# Altium footprint library ICs_imp.PCBLIB: 118 footprints (part 7 of 8)
Each footprint in its own frame and in the unit in brackets; x right, y up, seen from the top. Pads: shape width x height; smd on the part's side, far side on the other; paste and mask are expansions set on the pad; w line width, h text height; cw(c..) or ccw(c..) is an arc to the next point about the centre after c.
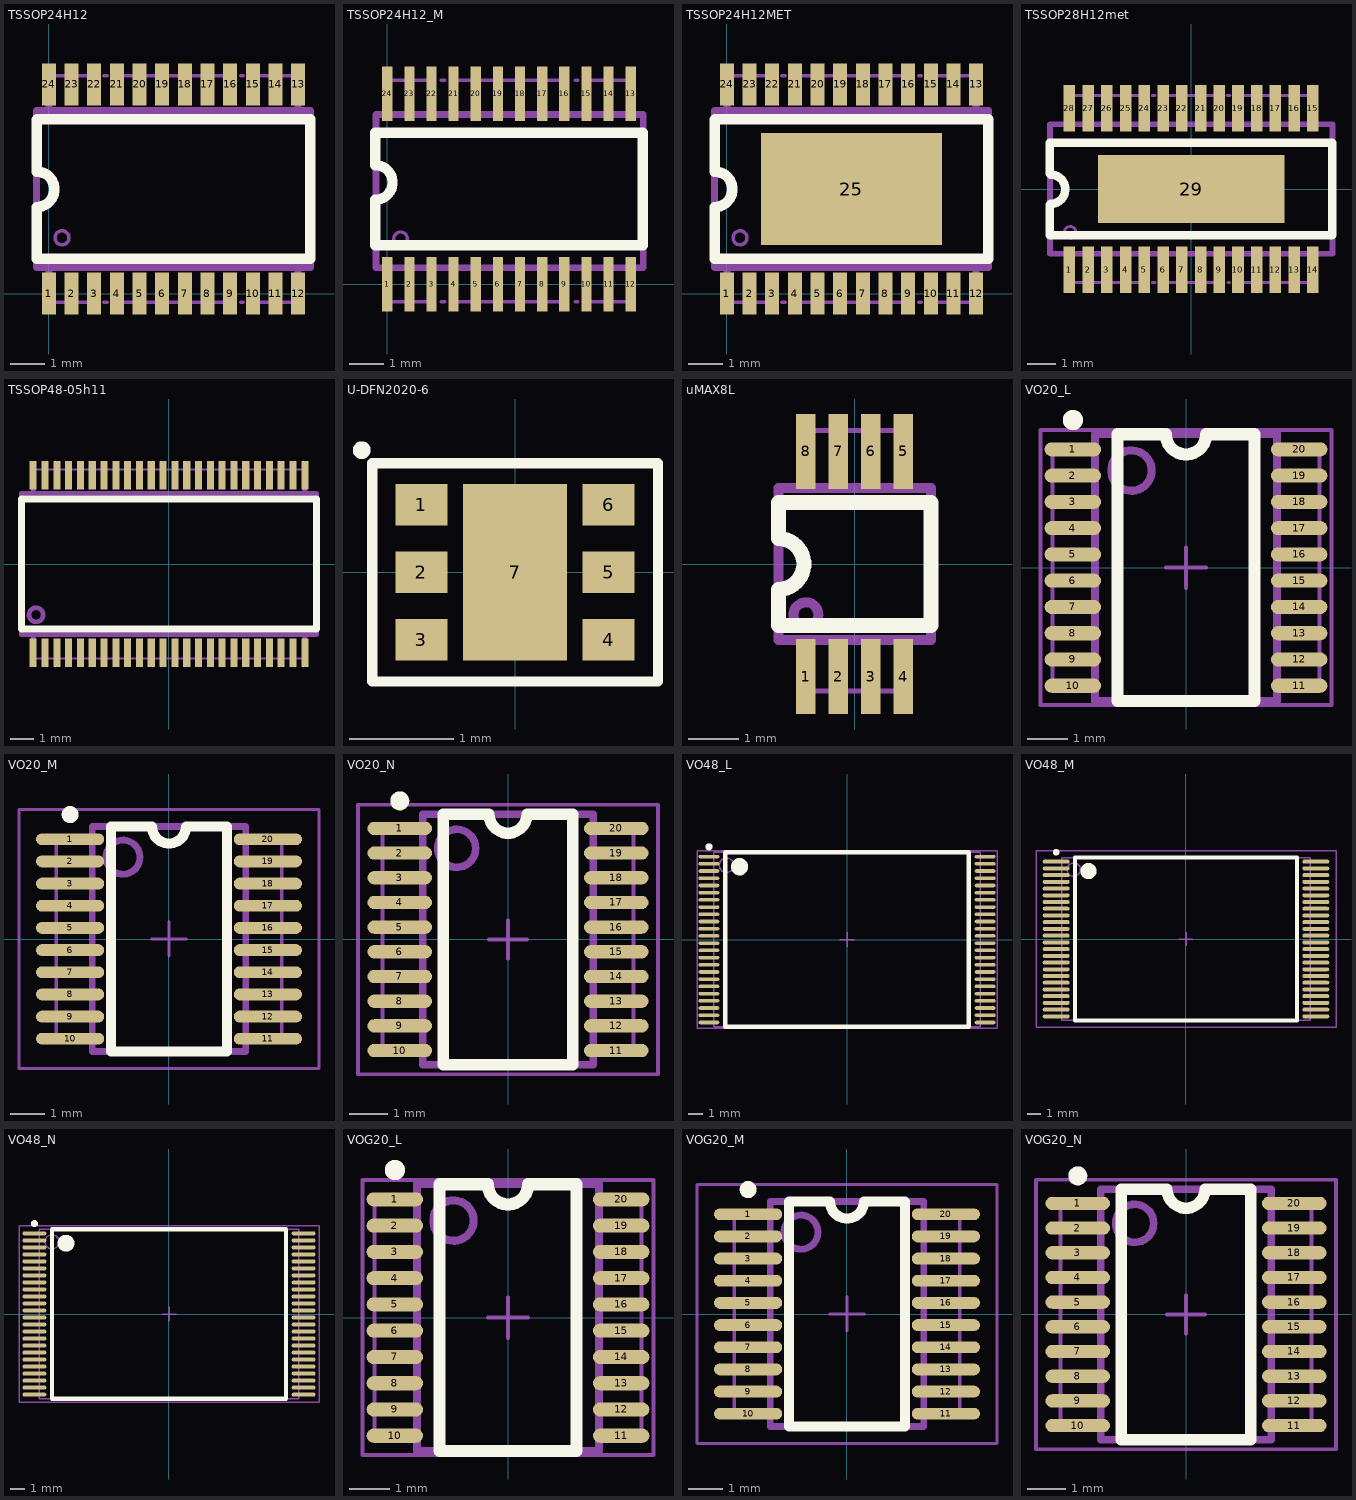
[diagram p6: the footprints below, top view; thin cyan lines are the x and y axes]

## TSSOP24H12 [mm]
height 1.2
pads (24):
  rect 0.4x1.2 smd: 1(0,0) 2(0.65,0) 3(1.3,0) 4(1.95,0) 5(2.6,0) 6(3.25,0) 7(3.9,0) 8(4.55,0) 9(5.2,0) 10(5.85,0) 11(6.5,0) 12(7.15,0) 13(7.15,6) 14(6.5,6) 15(5.85,6) 16(5.2,6) 17(4.55,6) 18(3.9,6) 19(3.25,6) 20(2.6,6) 21(1.95,6) 22(1.3,6) 23(0.65,6) 24(0,6)
Top Overlay:
  lines w0.3: -0.35,1 -0.35,2.484 ccw(c-0.35,2.992) -0.35,3.5 -0.35,4.992 -0.342,5 7.5,5 7.5,1 -0.35,1
Mechanical 1:
  circle w0.1: c0.375,1.6 r0.2
  lines w0.1: 0,6.25 1.3,6.25 ; 0.025,-0.25 1.3,-0.25 ; 1.575,-0.25 1.675,-0.25 ; 1.575,6.25 1.675,6.25 ; 1.95,-0.25 5.2,-0.25 ; 1.95,6.25 5.2,6.25 ; 5.5,-0.25 5.575,-0.25 ; 5.5,6.25 5.575,6.25 ; 5.85,-0.25 7.15,-0.25 ; 5.85,6.25 7.15,6.25
  lines w0.2: 0,-0.25 0,0.75 ; 0,5.25 0,6.25 ; 7.15,-0.25 7.15,0.75 ; 7.15,5.25 7.15,6.25 ; -0.35,0.75 -0.35,5.25 7.5,5.25 7.5,0.75 -0.35,0.75
  text "24" at 0.3,3.75 h1.5
  text ".Comment" at 0.51,2.11 h1.5
  text ".Designator" at 2.1,3.81 h1.5
3D body "TSSOP24h12.stp": height 1.21, standoff 0, extent -0.375,-0.3 7.525,6.3

## TSSOP24H12_M [mm]
height 1.2
pads (24):
  rect 0.3x1.6 smd: 1(0,0) 2(0.65,0) 3(1.3,0) 4(1.95,0) 5(2.6,0) 6(3.25,0) 7(3.9,0) 8(4.55,0) 9(5.2,0) 10(5.85,0) 11(6.5,0) 12(7.15,0) 13(7.15,5.6) 14(6.5,5.6) 15(5.85,5.6) 16(5.2,5.6) 17(4.55,5.6) 18(3.9,5.6) 19(3.25,5.6) 20(2.6,5.6) 21(1.95,5.6) 22(1.3,5.6) 23(0.65,5.6) 24(0,5.6)
Top Overlay:
  lines w0.3: -0.35,4.45 -0.35,3.5 cw(c-0.35,2.992) -0.35,2.484 -0.35,1.15 7.5,1.15 7.5,4.45 -0.342,4.45
Mechanical 1:
  circle w0.1: c0.392,1.338 r0.2
  lines w0.1: 0.017,5.988 1.317,5.988 ; 0.042,-0.512 1.317,-0.512 ; 1.592,-0.512 1.692,-0.512 ; 1.592,5.988 1.692,5.988 ; 1.967,-0.512 5.217,-0.512 ; 1.967,5.988 5.217,5.988 ; 5.517,-0.512 5.592,-0.512 ; 5.517,5.988 5.592,5.988 ; 5.867,-0.512 7.167,-0.512 ; 5.867,5.988 7.167,5.988
  lines w0.2: 0.017,-0.512 0.017,0.488 ; 0.017,4.988 0.017,5.988 ; 7.167,-0.512 7.167,0.488 ; 7.167,4.988 7.167,5.988 ; -0.333,0.488 7.517,0.488 7.517,4.988 -0.333,4.988 -0.333,0.488
  text ".Designator" at 2.117,3.548 h1.5
  text ".Comment" at 0.527,1.848 h1.5
  text "24" at 0.317,3.488 h1.5
3D body "TSSOP24h12.stp": height 1.21, standoff 0, extent -0.375,-0.55 7.525,6.05

## TSSOP24H12MET [mm]
height 1.2
pads (25):
  rect 0.4x1.2 smd: 1(0,0) 2(0.65,0) 3(1.3,0) 4(1.95,0) 5(2.6,0) 6(3.25,0) 7(3.9,0) 8(4.55,0) 9(5.2,0) 10(5.85,0) 11(6.5,0) 12(7.15,0) 13(7.15,6) 14(6.5,6) 15(5.85,6) 16(5.2,6) 17(4.55,6) 18(3.9,6) 19(3.25,6) 20(2.6,6) 21(1.95,6) 22(1.3,6) 23(0.65,6) 24(0,6)
  rect 5.2x3.2 smd: 25(3.575,3)
Top Overlay:
  lines w0.3: -0.35,1 -0.35,2.484 ccw(c-0.35,2.992) -0.35,3.5 -0.35,4.992 -0.342,5 7.5,5 7.5,1 -0.35,1
Mechanical 1:
  circle w0.1: c0.375,1.6 r0.2
  lines w0.1: 0,6.25 1.3,6.25 ; 0.025,-0.25 1.3,-0.25 ; 1.575,-0.25 1.675,-0.25 ; 1.575,6.25 1.675,6.25 ; 1.95,-0.25 5.2,-0.25 ; 1.95,6.25 5.2,6.25 ; 5.5,-0.25 5.575,-0.25 ; 5.5,6.25 5.575,6.25 ; 5.85,-0.25 7.15,-0.25 ; 5.85,6.25 7.15,6.25
  lines w0.2: 0,-0.25 0,0.75 ; 0,5.25 0,6.25 ; 7.15,-0.25 7.15,0.75 ; 7.15,5.25 7.15,6.25 ; -0.35,0.75 -0.35,5.25 7.5,5.25 7.5,0.75 -0.35,0.75
  text "24" at 0.3,3.75 h1.5
  text ".Comment" at 0.51,2.11 h1.5
  text ".Designator" at 2.1,3.81 h1.5
3D body "TSSOP24h12.stp": height 1.21, standoff 0, extent -0.375,-0.3 7.525,6.3

## TSSOP28H12met [mm]
height 1.2
pads (29):
  rect 0.4x1.6 smd: 1(-4.225,-2.8) 2(-3.575,-2.8) 3(-2.925,-2.8) 4(-2.275,-2.8) 5(-1.625,-2.8) 6(-0.975,-2.8) 7(-0.325,-2.8) 8(0.325,-2.8) 9(0.975,-2.8) 10(1.625,-2.8) 11(2.275,-2.8) 12(2.925,-2.8) 13(3.575,-2.8) 14(4.225,-2.8) 15(4.225,2.8) 16(3.575,2.8) 17(2.925,2.8) 18(2.275,2.8) 19(1.625,2.8) 20(0.975,2.8) 21(0.325,2.8) 22(-0.325,2.8) 23(-0.975,2.8) 24(-1.625,2.8) 25(-2.275,2.8) 26(-2.925,2.8) 27(-3.575,2.8) 28(-4.225,2.8)
  rect 6.46x2.35 smd: 29(0,0)
Top Overlay:
  lines w0.3: -4.9,-1.6 4.9,-1.6 4.9,1.6 -4.9,1.6 -4.9,0.525 -4.875,0.5 cw(c-4.875,-0.008) -4.875,-0.516 -4.9,-0.541 -4.9,-1.6
Mechanical 1:
  circle w0.1: c-4.2,-1.5 r0.2
  lines w0.1: -4.225,-3.25 -1.625,-3.25 ; -4.225,3.25 -1.625,3.25 ; -1.35,-3.25 -1.25,-3.25 ; -1.35,3.25 -1.25,3.25 ; -0.975,-3.25 0.975,-3.25 ; -0.975,3.25 0.975,3.25 ; 1.25,3.25 1.35,3.25 ; 1.275,-3.25 1.325,-3.25 ; 1.625,-3.25 4.225,-3.25 ; 1.625,3.25 4.225,3.25
  lines w0.2: -4.225,-3.25 -4.225,-2.25 ; -4.225,2.25 -4.225,3.25 ; 4.225,-3.25 4.225,-2.25 ; 4.225,2.25 4.225,3.25 ; -4.9,-2.25 4.9,-2.25 4.9,2.25 -4.9,2.25 -4.9,-2.25
  text "28" at -4.55,0.65 h1.5
  text ".Comment" at -3.805,-1.02 h1.5
  text ".Designator" at -2.215,0.68 h1.5
3D body "TSSOP28h12.stp": height 1.21, standoff 0, extent -4.9,-3.3 4.9,3.3

## TSSOP48-05h11 [mm]
height 1.1
pads (48):
  rect 0.3x1.2 smd: 1(-5.75,-3.75) 2(-5.25,-3.75) 3(-4.75,-3.75) 4(-4.25,-3.75) 5(-3.75,-3.75) 6(-3.25,-3.75) 7(-2.75,-3.75) 8(-2.25,-3.75) 9(-1.75,-3.75) 10(-1.25,-3.75) 11(-0.75,-3.75) 12(-0.25,-3.75) 13(0.25,-3.75) 14(0.75,-3.75) 15(1.25,-3.75) 16(1.75,-3.75) 17(2.25,-3.75) 18(2.75,-3.75) 19(3.25,-3.75) 20(3.75,-3.75) 21(4.25,-3.75) 22(4.75,-3.75) 23(5.25,-3.75) 24(5.75,-3.75) 25(5.75,3.75) 26(5.25,3.75) 27(4.75,3.75) 28(4.25,3.75) 29(3.75,3.75) 30(3.25,3.75) 31(2.75,3.75) 32(2.25,3.75) 33(1.75,3.75) 34(1.25,3.75) 35(0.75,3.75) 36(0.25,3.75) 37(-0.25,3.75) 38(-0.75,3.75) 39(-1.25,3.75) 40(-1.75,3.75) 41(-2.25,3.75) 42(-2.75,3.75) 43(-3.25,3.75) 44(-3.75,3.75) 45(-4.25,3.75) 46(-4.75,3.75) 47(-5.25,3.75) 48(-5.75,3.75)
Top Overlay:
  lines w0.3: -6.25,-2.75 6.25,-2.75 6.25,2.75 -6.25,2.75 -6.25,-2.75
Mechanical 1:
  circle w0.2: c-5.625,-2.15 r0.3
  lines w0.1: -5.75,-4 -0.4,-4 ; -5.75,4 -0.4,4 ; -0.05,-4 0.05,-4 ; -0.05,4 0.05,4 ; 0.4,-4 5.75,-4 ; 0.4,4 5.75,4
  lines w0.2: -5.75,-4 -5.75,-3 ; -5.75,3 -5.75,4 ; 5.75,-4 5.75,-3 ; 5.75,3 5.75,4 ; -6.25,-3 6.25,-3 6.25,3 -6.25,3 -6.25,-3
  text "48" at -5.623,1.457 h1.5
  text ".Designator" at -0.765,0.63 h1.5
  text ".Comment" at -2.355,-1.07 h1.5
3D body "TSSOP48-05h11.stp": height 1.21, standoff 0, extent -6.25,-4 6.25,4

## U-DFN2020-6 [mm]
pads (7):
  rect 0.5x0.4 smd: 1(-0.9,0.65) 2(-0.9,0) 3(-0.9,-0.65) 4(0.9,-0.65) 5(0.9,0) 6(0.9,0.65)
  rect 1x1.7 smd: 7(0,0)
Top Overlay:
  circle w0.1: c-1.475,1.175 r0.035
  lines w0.1: -1.375,-1.05 -1.375,1.05 1.375,1.05 1.375,-1.05 -1.375,-1.05
3D body: height 0.56, standoff 0, extent -1.05,-1 1.05,1

## uMAX8L [mm]
height 1.1
pads (8):
  rect 0.39x1.5 smd: 1(-0.975,-2.25) 2(-0.325,-2.25) 3(0.325,-2.25) 4(0.975,-2.25) 5(0.975,2.25) 6(0.325,2.25) 7(-0.325,2.25) 8(-0.975,2.25)
Top Overlay:
  lines w0.3: -1.524,-1.23 1.524,-1.23 1.524,1.23 -1.524,1.23 -1.524,0.508 cw(c-1.524,0) -1.524,-0.508 -1.524,-1.23
Mechanical 1:
  circle w0.2: c-0.975,-1.016 r0.25
  lines w0.1: -1.016,-2.54 -0.381,-2.54 ; -1.016,2.667 -0.381,2.667 ; -0.127,-2.54 0.127,-2.54 ; -0.127,2.667 0.127,2.667 ; 0.381,-2.54 1.016,-2.54 ; 0.381,2.667 1.016,2.667
  lines w0.2: -1.016,-2.54 -1.016,-1.524 ; -1.016,1.651 -1.016,2.667 ; 1.016,-2.54 1.016,-1.524 ; 1.016,1.651 1.016,2.667 ; -1.524,-1.524 -1.524,1.524 1.524,1.524 1.524,-1.524 -1.524,-1.524
  text ".Comment" at -1.225,-1.1 h1.5
  text ".Designator" at -1.3,0.3 h1.5

## VO20_L [mm] "TSOP, 20-Leads, Body 6.5x4.4mm, Pitch 0.65mm, IPC High Density"
height 1.2
pads (20):
  oval 1.4x0.35 smd: 1(-2.8,2.925) 2(-2.8,2.275) 3(-2.8,1.625) 4(-2.8,0.975) 5(-2.8,0.325) 6(-2.8,-0.325) 7(-2.8,-0.975) 8(-2.8,-1.625) 9(-2.8,-2.275) 10(-2.8,-2.925) 11(2.8,-2.925) 12(2.8,-2.275) 13(2.8,-1.625) 14(2.8,-0.975) 15(2.8,-0.325) 16(2.8,0.325) 17(2.8,0.975) 18(2.8,1.625) 19(2.8,2.275) 20(2.8,2.925)
Top Overlay:
  circle w0.25: c-2.8,3.65 r0.125
  lines w0.3: -1.7,-3.3 1.7,-3.3 1.7,3.3 0.5,3.3 cw(c0,3.3) -0.5,3.3 -1.7,3.3 -1.7,-3.3
Mechanical 1:
  circle w0.2: c-1.35,2.4 r0.5
  lines w0.1: -3.302,-2.921 -3.302,-0.5 ; -3.302,-0.127 -3.302,0.127 ; -3.302,0.5 -3.302,2.921 ; 3.302,-2.921 3.302,-0.5 ; 3.302,-0.127 3.302,0.127 ; 3.302,0.5 3.302,2.921
  lines w0.2: -3.302,-2.921 -2.25,-2.921 ; -3.302,2.921 -2.25,2.921 ; 2.25,-2.921 3.302,-2.921 ; 2.25,2.921 3.302,2.921 ; -2.25,-3.3 2.25,-3.3 2.25,3.3 -2.25,3.3 -2.25,-3.3
  text ".Comment" at -1.7,2.9 h1.5
  text ".Designator" at 0.85,1.61 h1.5
Mechanical 15:
  lines w0.1: -0.5,0 0.5,0 ; 0,-0.5 0,0.5 ; -3.6,-3.4 3.6,-3.4 3.6,3.4 -3.6,3.4 -3.6,-3.4
3D body: height 1.2, standoff 0, extent -2.25,-3.3 2.25,3.3

## VO20_M [mm] "TSOP, 20-Leads, Body 6.5x4.4mm, Pitch 0.65mm, IPC Low Density"
height 1.2
pads (20):
  oval 2x0.35 smd: 1(-2.9,2.925) 2(-2.9,2.275) 3(-2.9,1.625) 4(-2.9,0.975) 5(-2.9,0.325) 6(-2.9,-0.325) 7(-2.9,-0.975) 8(-2.9,-1.625) 9(-2.9,-2.275) 10(-2.9,-2.925) 11(2.9,-2.925) 12(2.9,-2.275) 13(2.9,-1.625) 14(2.9,-0.975) 15(2.9,-0.325) 16(2.9,0.325) 17(2.9,0.975) 18(2.9,1.625) 19(2.9,2.275) 20(2.9,2.925)
Top Overlay:
  circle w0.25: c-2.9,3.65 r0.125
  lines w0.3: -1.7,-3.3 -1.7,3.3 -0.5,3.3 ccw(c0,3.3) 0.5,3.3 1.7,3.3 1.7,-3.3 -1.7,-3.3
Mechanical 1:
  circle w0.2: c-1.35,2.4 r0.5
  lines w0.1: -3.302,-2.921 -3.302,-0.5 ; -3.302,-0.127 -3.302,0.127 ; -3.302,0.5 -3.302,2.921 ; 3.302,-2.921 3.302,-0.5 ; 3.302,-0.127 3.302,0.127 ; 3.302,0.5 3.302,2.921
  lines w0.2: -3.302,-2.921 -2.25,-2.921 ; -3.302,2.921 -2.25,2.921 ; 2.25,-2.921 3.302,-2.921 ; 2.25,2.921 3.302,2.921 ; -2.25,-3.3 -2.25,3.3 2.25,3.3 2.25,-3.3 -2.25,-3.3
  text ".Comment" at -1.7,2.9 h1.5
  text ".Designator" at 0.85,1.61 h1.5
Mechanical 15:
  lines w0.1: -0.5,0 0.5,0 ; 0,-0.5 0,0.5 ; -4.4,-3.8 4.4,-3.8 4.4,3.8 -4.4,3.8 -4.4,-3.8
3D body: height 1.2, standoff 0, extent -2.25,-3.3 2.25,3.3

## VO20_N [mm] "TSOP, 20-Leads, Body 6.5x4.4mm, Pitch 0.65mm, IPC Medium Density"
height 1.2
pads (20):
  oval 1.7x0.35 smd: 1(-2.85,2.925) 2(-2.85,2.275) 3(-2.85,1.625) 4(-2.85,0.975) 5(-2.85,0.325) 6(-2.85,-0.325) 7(-2.85,-0.975) 8(-2.85,-1.625) 9(-2.85,-2.275) 10(-2.85,-2.925) 11(2.85,-2.925) 12(2.85,-2.275) 13(2.85,-1.625) 14(2.85,-0.975) 15(2.85,-0.325) 16(2.85,0.325) 17(2.85,0.975) 18(2.85,1.625) 19(2.85,2.275) 20(2.85,2.925)
Top Overlay:
  circle w0.25: c-2.85,3.65 r0.125
  lines w0.3: -1.7,-3.3 1.7,-3.3 1.7,3.3 0.5,3.3 cw(c0,3.3) -0.5,3.3 -1.7,3.3 -1.7,-3.3
Mechanical 1:
  circle w0.2: c-1.35,2.4 r0.5
  lines w0.1: -3.302,-2.921 -3.302,-0.5 ; -3.302,-0.127 -3.302,0.127 ; -3.302,0.5 -3.302,2.921 ; 3.302,-2.921 3.302,-0.5 ; 3.302,-0.127 3.302,0.127 ; 3.302,0.5 3.302,2.921
  lines w0.2: -3.302,-2.921 -2.25,-2.921 ; -3.302,2.921 -2.25,2.921 ; 2.25,-2.921 3.302,-2.921 ; 2.25,2.921 3.302,2.921 ; -2.25,-3.3 -2.25,3.3 2.25,3.3 2.25,-3.3 -2.25,-3.3
  text ".Comment" at -1.7,2.9 h1.5
  text ".Designator" at 0.85,1.61 h1.5
Mechanical 15:
  lines w0.1: -0.5,0 0.5,0 ; 0,-0.5 0,0.5 ; -3.95,-3.55 -3.95,3.55 3.95,3.55 3.95,-3.55 -3.95,-3.55
3D body: height 1.2, standoff 0, extent -2.25,-3.3 2.25,3.3

## VO48_L [mm] "TSSOP, 48-Leads, Body 12x18.5mm, Pitch 0.5mm, IPC High Density"
height 1.2
pads (48):
  oval 1.45x0.25 smd: 1(-9.575,5.75) 2(-9.575,5.25) 3(-9.575,4.75) 4(-9.575,4.25) 5(-9.575,3.75) 6(-9.575,3.25) 7(-9.575,2.75) 8(-9.575,2.25) 9(-9.575,1.75) 10(-9.575,1.25) 11(-9.575,0.75) 12(-9.575,0.25) 13(-9.575,-0.25) 14(-9.575,-0.75) 15(-9.575,-1.25) 16(-9.575,-1.75) 17(-9.575,-2.25) 18(-9.575,-2.75) 19(-9.575,-3.25) 20(-9.575,-3.75) 21(-9.575,-4.25) 22(-9.575,-4.75) 23(-9.575,-5.25) 24(-9.575,-5.75) 25(9.575,-5.75) 26(9.575,-5.25) 27(9.575,-4.75) 28(9.575,-4.25) 29(9.575,-3.75) 30(9.575,-3.25) 31(9.575,-2.75) 32(9.575,-2.25) 33(9.575,-1.75) 34(9.575,-1.25) 35(9.575,-0.75) 36(9.575,-0.25) 37(9.575,0.25) 38(9.575,0.75) 39(9.575,1.25) 40(9.575,1.75) 41(9.575,2.25) 42(9.575,2.75) 43(9.575,3.25) 44(9.575,3.75) 45(9.575,4.25) 46(9.575,4.75) 47(9.575,5.25) 48(9.575,5.75)
Top Overlay:
  circle w0.6: c-7.45,5.05 r0.3
  circle w0.25: c-9.575,6.425 r0.125
  lines w0.3: -8.45,-6.05 8.45,-6.05 8.45,6.05 -8.45,6.05 -8.45,-6.05
Mechanical 13:
  circle w0.1: c-8.35,5.15 r0.5
  lines w0.1: -9.25,-6.05 9.25,-6.05 9.25,6.05 -9.25,6.05 -9.25,-6.05
Mechanical 15:
  lines w0.1: -0.5,0 0.5,0 ; 0,-0.5 0,0.5 ; -10.4,-6.15 10.4,-6.15 10.4,6.15 -10.4,6.15 -10.4,-6.15
3D body: height 1.2, standoff 0, extent -9.25,-6.05 9.25,6.05

## VO48_M [mm] "TSSOP, 48-Leads, Body 12x18.5mm, Pitch 0.5mm, IPC Low Density"
height 1.2
pads (48):
  oval 2x0.3 smd: 1(-9.65,5.75) 2(-9.65,5.25) 3(-9.65,4.75) 4(-9.65,4.25) 5(-9.65,3.75) 6(-9.65,3.25) 7(-9.65,2.75) 8(-9.65,2.25) 9(-9.65,1.75) 10(-9.65,1.25) 11(-9.65,0.75) 12(-9.65,0.25) 13(-9.65,-0.25) 14(-9.65,-0.75) 15(-9.65,-1.25) 16(-9.65,-1.75) 17(-9.65,-2.25) 18(-9.65,-2.75) 19(-9.65,-3.25) 20(-9.65,-3.75) 21(-9.65,-4.25) 22(-9.65,-4.75) 23(-9.65,-5.25) 24(-9.65,-5.75) 25(9.65,-5.75) 26(9.65,-5.25) 27(9.65,-4.75) 28(9.65,-4.25) 29(9.65,-3.75) 30(9.65,-3.25) 31(9.65,-2.75) 32(9.65,-2.25) 33(9.65,-1.75) 34(9.65,-1.25) 35(9.65,-0.75) 36(9.65,-0.25) 37(9.65,0.25) 38(9.65,0.75) 39(9.65,1.25) 40(9.65,1.75) 41(9.65,2.25) 42(9.65,2.75) 43(9.65,3.25) 44(9.65,3.75) 45(9.65,4.25) 46(9.65,4.75) 47(9.65,5.25) 48(9.65,5.75)
Top Overlay:
  circle w0.6: c-7.25,5.05 r0.3
  circle w0.25: c-9.65,6.45 r0.125
  lines w0.3: -8.25,-6.05 8.25,-6.05 8.25,6.05 -8.25,6.05 -8.25,-6.05
Mechanical 13:
  circle w0.1: c-8.35,5.15 r0.5
  lines w0.1: -9.25,-6.05 9.25,-6.05 9.25,6.05 -9.25,6.05 -9.25,-6.05
Mechanical 15:
  lines w0.1: -0.5,0 0.5,0 ; 0,-0.5 0,0.5 ; -11.15,-6.55 11.15,-6.55 11.15,6.55 -11.15,6.55 -11.15,-6.55
3D body: height 1.2, standoff 0, extent -9.25,-6.05 9.25,6.05

## VO48_N [mm] "TSSOP, 48-Leads, Body 12x18.5mm, Pitch 0.5mm, IPC Medium Density"
height 1.2
pads (48):
  oval 1.7x0.3 smd: 1(-9.6,5.75) 2(-9.6,5.25) 3(-9.6,4.75) 4(-9.6,4.25) 5(-9.6,3.75) 6(-9.6,3.25) 7(-9.6,2.75) 8(-9.6,2.25) 9(-9.6,1.75) 10(-9.6,1.25) 11(-9.6,0.75) 12(-9.6,0.25) 13(-9.6,-0.25) 14(-9.6,-0.75) 15(-9.6,-1.25) 16(-9.6,-1.75) 17(-9.6,-2.25) 18(-9.6,-2.75) 19(-9.6,-3.25) 20(-9.6,-3.75) 21(-9.6,-4.25) 22(-9.6,-4.75) 23(-9.6,-5.25) 24(-9.6,-5.75) 25(9.6,-5.75) 26(9.6,-5.25) 27(9.6,-4.75) 28(9.6,-4.25) 29(9.6,-3.75) 30(9.6,-3.25) 31(9.6,-2.75) 32(9.6,-2.25) 33(9.6,-1.75) 34(9.6,-1.25) 35(9.6,-0.75) 36(9.6,-0.25) 37(9.6,0.25) 38(9.6,0.75) 39(9.6,1.25) 40(9.6,1.75) 41(9.6,2.25) 42(9.6,2.75) 43(9.6,3.25) 44(9.6,3.75) 45(9.6,4.25) 46(9.6,4.75) 47(9.6,5.25) 48(9.6,5.75)
Top Overlay:
  circle w0.25: c-9.6,6.45 r0.125
  circle w0.6: c-7.35,5.05 r0.3
  lines w0.3: -8.35,-6.05 -8.35,6.05 8.35,6.05 8.35,-6.05 -8.35,-6.05
Mechanical 13:
  circle w0.1: c-8.35,5.15 r0.5
  lines w0.1: -9.25,-6.05 -9.25,6.05 9.25,6.05 9.25,-6.05 -9.25,-6.05
Mechanical 15:
  lines w0.1: -0.5,0 0.5,0 ; 0,-0.5 0,0.5 ; -10.7,-6.3 -10.7,6.3 10.7,6.3 10.7,-6.3 -10.7,-6.3
3D body: height 1.2, standoff 0, extent -9.25,-6.05 9.25,6.05

## VOG20_L [mm] "TSOP, 20-Leads, Body 6.5x4.4mm, Pitch 0.65mm, IPC High Density"
height 1.2
pads (20):
  oval 1.4x0.35 smd: 1(-2.8,2.925) 2(-2.8,2.275) 3(-2.8,1.625) 4(-2.8,0.975) 5(-2.8,0.325) 6(-2.8,-0.325) 7(-2.8,-0.975) 8(-2.8,-1.625) 9(-2.8,-2.275) 10(-2.8,-2.925) 11(2.8,-2.925) 12(2.8,-2.275) 13(2.8,-1.625) 14(2.8,-0.975) 15(2.8,-0.325) 16(2.8,0.325) 17(2.8,0.975) 18(2.8,1.625) 19(2.8,2.275) 20(2.8,2.925)
Top Overlay:
  circle w0.25: c-2.8,3.65 r0.125
  lines w0.3: -1.7,-3.3 -1.7,3.3 -0.5,3.3 ccw(c0,3.3) 0.5,3.3 1.7,3.3 1.7,-3.3 -1.7,-3.3
Mechanical 1:
  circle w0.2: c-1.35,2.4 r0.5
  lines w0.1: -3.302,-2.921 -3.302,-0.5 ; -3.302,-0.127 -3.302,0.127 ; -3.302,0.5 -3.302,2.921 ; 3.302,-2.921 3.302,-0.5 ; 3.302,-0.127 3.302,0.127 ; 3.302,0.5 3.302,2.921
  lines w0.2: -3.302,-2.921 -2.25,-2.921 ; -3.302,2.921 -2.25,2.921 ; 2.25,-2.921 3.302,-2.921 ; 2.25,2.921 3.302,2.921 ; -2.25,-3.3 -2.25,3.3 2.25,3.3 2.25,-3.3 -2.25,-3.3
  text ".Comment" at -1.7,2.9 h1.5
  text ".Designator" at 0.85,1.61 h1.5
Mechanical 15:
  lines w0.1: -0.5,0 0.5,0 ; 0,-0.5 0,0.5 ; -3.6,-3.4 3.6,-3.4 3.6,3.4 -3.6,3.4 -3.6,-3.4
3D body: height 1.2, standoff 0, extent -2.25,-3.3 2.25,3.3

## VOG20_M [mm] "TSOP, 20-Leads, Body 6.5x4.4mm, Pitch 0.65mm, IPC Low Density"
height 1.2
pads (20):
  oval 2x0.35 smd: 1(-2.9,2.925) 2(-2.9,2.275) 3(-2.9,1.625) 4(-2.9,0.975) 5(-2.9,0.325) 6(-2.9,-0.325) 7(-2.9,-0.975) 8(-2.9,-1.625) 9(-2.9,-2.275) 10(-2.9,-2.925) 11(2.9,-2.925) 12(2.9,-2.275) 13(2.9,-1.625) 14(2.9,-0.975) 15(2.9,-0.325) 16(2.9,0.325) 17(2.9,0.975) 18(2.9,1.625) 19(2.9,2.275) 20(2.9,2.925)
Top Overlay:
  circle w0.25: c-2.9,3.65 r0.125
  lines w0.3: -1.7,-3.3 -1.7,3.3 -0.5,3.3 ccw(c0,3.3) 0.5,3.3 1.7,3.3 1.7,-3.3 -1.7,-3.3
Mechanical 1:
  circle w0.2: c-1.35,2.4 r0.5
  lines w0.1: -3.302,-2.921 -3.302,-0.5 ; -3.302,-0.127 -3.302,0.127 ; -3.302,0.5 -3.302,2.921 ; 3.302,-2.921 3.302,-0.5 ; 3.302,-0.127 3.302,0.127 ; 3.302,0.5 3.302,2.921
  lines w0.2: -3.302,-2.921 -2.25,-2.921 ; -3.302,2.921 -2.25,2.921 ; 2.25,-2.921 3.302,-2.921 ; 2.25,2.921 3.302,2.921 ; -2.25,-3.3 -2.25,3.3 2.25,3.3 2.25,-3.3 -2.25,-3.3
  text ".Designator" at 0.85,1.61 h1.5
  text ".Comment" at -1.7,2.9 h1.5
Mechanical 15:
  lines w0.1: -0.5,0 0.5,0 ; 0,-0.5 0,0.5 ; -4.4,-3.8 4.4,-3.8 4.4,3.8 -4.4,3.8 -4.4,-3.8
3D body: height 1.2, standoff 0, extent -2.25,-3.3 2.25,3.3

## VOG20_N [mm] "TSOP, 20-Leads, Body 6.5x4.4mm, Pitch 0.65mm, IPC Medium Density"
height 1.2
pads (20):
  oval 1.7x0.35 smd: 1(-2.85,2.925) 2(-2.85,2.275) 3(-2.85,1.625) 4(-2.85,0.975) 5(-2.85,0.325) 6(-2.85,-0.325) 7(-2.85,-0.975) 8(-2.85,-1.625) 9(-2.85,-2.275) 10(-2.85,-2.925) 11(2.85,-2.925) 12(2.85,-2.275) 13(2.85,-1.625) 14(2.85,-0.975) 15(2.85,-0.325) 16(2.85,0.325) 17(2.85,0.975) 18(2.85,1.625) 19(2.85,2.275) 20(2.85,2.925)
Top Overlay:
  circle w0.25: c-2.85,3.65 r0.125
  lines w0.3: -1.7,-3.3 1.7,-3.3 1.7,3.3 0.5,3.3 cw(c0,3.3) -0.5,3.3 -1.7,3.3 -1.7,-3.3
Mechanical 1:
  circle w0.2: c-1.35,2.4 r0.5
  lines w0.1: -3.302,-2.921 -3.302,-0.5 ; -3.302,-0.127 -3.302,0.127 ; -3.302,0.5 -3.302,2.921 ; 3.302,-2.921 3.302,-0.5 ; 3.302,-0.127 3.302,0.127 ; 3.302,0.5 3.302,2.921
  lines w0.2: -3.302,-2.921 -2.25,-2.921 ; -3.302,2.921 -2.25,2.921 ; 2.25,-2.921 3.302,-2.921 ; 2.25,2.921 3.302,2.921 ; -2.25,-3.3 2.25,-3.3 2.25,3.3 -2.25,3.3 -2.25,-3.3
  text ".Comment" at -1.7,2.9 h1.5
  text ".Designator" at 0.85,1.61 h1.5
Mechanical 15:
  lines w0.1: -0.5,0 0.5,0 ; 0,-0.5 0,0.5 ; -3.95,-3.55 3.95,-3.55 3.95,3.55 -3.95,3.55 -3.95,-3.55
3D body: height 1.2, standoff 0, extent -2.25,-3.3 2.25,3.3